# Altium footprint library PCB_Lib_Devzone.PcbLib: 491 footprints (part 3 of 31)
Each footprint in its own frame and in the unit in brackets; x right, y up, seen from the top. Pads: shape width x height; smd on the part's side, far side on the other; paste and mask are expansions set on the pad; w line width, h text height; cw(c..) or ccw(c..) is an arc to the next point about the centre after c.
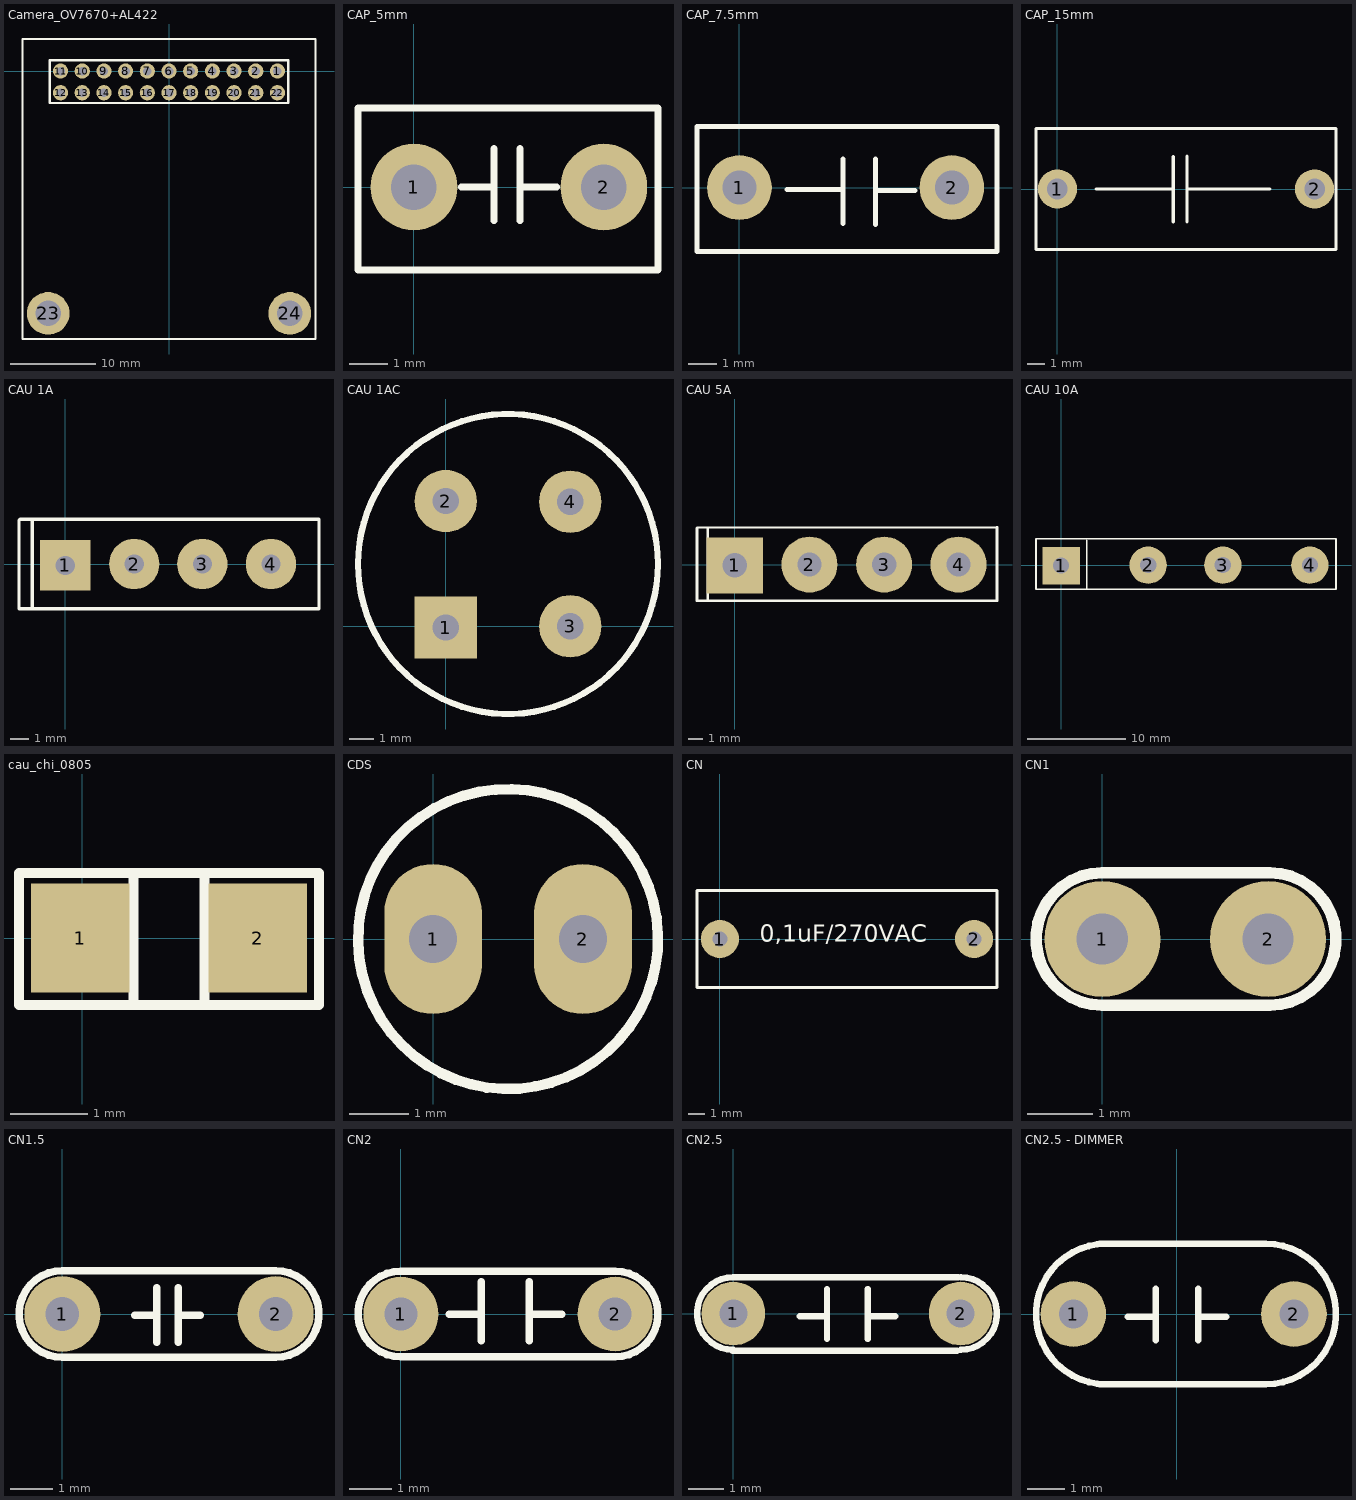
[diagram p2: the footprints below, top view; thin cyan lines are the x and y axes]

## Camera_OV7670+AL422 [mil]
pads (24):
  round 70 hole 39.37: 1(500,0) 2(400,0) 3(300,0) 4(200,0) 5(100,0) 6(0,0) 7(-100,0) 8(-200,0) 9(-300,0) 10(-400,0) 11(-500,0) 12(-500,-100) 13(-400,-100) 14(-300,-100) 15(-200,-100) 16(-100,-100) 17(0,-100) 18(100,-100) 19(200,-100) 20(300,-100) 21(400,-100) 22(500,-100)
  round 196.85 hole 118.11: 23(-557.09,-1117.56) 24(557.09,-1117.56)
Top Overlay:
  lines w10: -675.2,-1235.67 675.2,-1235.67 675.2,147.8 -675.2,147.8 -675.2,-1235.67 ; -550,-147 -550,50 550,50 550,-147 -550,-147

## CAP_5mm [mil]
pads (2):
  round 90 hole 47.24: 1(0,0) 2(196.85,0)
Top Overlay:
  lines w7: 49,0 83,0 ; 83,-35 83,0 ; 83,40 83,0 ; 110,-35 110,0 ; 110,40 110,0 ; 148,0 110,0 ; -58,-86 -58,82 253,82 253,-86 -58,-86

## CAP_7.5mm [mil]
pads (2):
  round 90 hole 47.24: 1(0,0) 2(295.28,0)
Top Overlay:
  lines w7: 66,-3 144,-3 ; 144,-50 144,-3 ; 144,40 144,-3 ; 189,-51 189,-4 ; 189,40 189,-4 ; 244,-4 189,-4 ; -59,-89 358,-89 358,85 -59,85 -59,-89

## CAP_15mm [mil]
pads (2):
  round 90 hole 47.24: 1(0,0) 2(590.55,0)
Top Overlay:
  lines w7: 89,0 266,0 266,75 ; 266,-76 266,19 ; 298,-76 298,76 ; 302,0 488,0 ; -49.21,-138.78 397,-138.78 639.76,-138.78 639.76,138.78 -49.21,138.78 -49.21,-138.78

## CAU 1A [mil] "CAU 1A DET"
height 800
pads (4):
  rect 110x110 hole 42: 1(0,-2)
  round 110 hole 42: 2(151,1) 3(300,1) 4(450,1)
Top Overlay:
  lines w7: -72,-95 -72,99 ; -101,-97 -101,97 -99,99 555,99 555,-97 -101,-97
3D body "SW3dPS-KBPM.STEP": height 453.36, standoff -499.4, extent -61.99,-90 511.99,107.24

## CAU 1AC [mil] "CAU 1A TRON"
height 800
pads (4):
  rect 100x100 hole 42: 1(0,-2)
  round 100 hole 42: 2(0,201) 3(200,0) 4(200,200)
Top Overlay:
  circle w10: c100,100 r240.88

## CAU 5A [mil] "CAU 5A DET"
height 800
pads (4):
  rect 150x150 hole 65: 1(0,-2)
  round 150 hole 65: 2(200,0) 3(400,0) 4(599,0)
Top Overlay:
  lines w7: -72,-95 -72,99 ; -101,-97 -101,97 -99,99 702,100 702,-97 -101,-97
3D body "SW3dPS-bridge 2.STEP": height 820.68, standoff -621.62, extent -138.98,-105 738.98,43.03

## CAU 10A [mil] "CAU 10A det"
height 800
pads (4):
  rect 150x150 hole 65: 1(0,-2)
  round 150 hole 65: 2(350,0) 3(650,0) 4(1000,0)
Top Overlay:
  lines w7: 103,-95 103,99 ; -101,-97 -101,104.86 1105,106.36 1105,-97 -101,-97

## cau_chi_0805 [mil]
pads (2):
  rect 50x55 smd: 1(-1,0) 2(89,0)
Top Overlay:
  lines w5: 26,-34 26,33 ; 62,-34 62,32 ; -32,-34 -32,33 120,33 120,-34 -32,-34
3D body "User Library-NFM21H.STEP": height 33.86, standoff -0.39, extent 4.63,-25 83.37,25

## CDS [mil] "QUANG TRO"
height 300
pads (2):
  oval 65x100 hole 32: 1(0,0) 2(100,0)
Top Overlay:
  lines w7: 136.62,-49.97 cw(c50,0) 137.42,-48.56
3D body "User Library-5mmPhotoResistor.STEP": height 159.37, standoff -76.85, extent -47.43,-99.42 129.74,97.43

## CN [mil] "Tu loc 220"
height 100
pads (2):
  round 90 hole 35: 1(0,0) 2(600,0)
Top Overlay:
  lines w7: -54,-115 654,-115 654,115 -54,115 -54,-115
  text "0,1uF/270VAC" at 94,-21 h70

## CN1 [mil]
height 200
pads (2):
  round 70 hole 31: 1(0,0) 2(100,0)
Top Overlay:
  lines w7: 100,-40 0,-40 cw(c0,0) 0,40 100,40 ; 101,-40 ccw(c101,0) 101,40
3D body "SW3dPS-Cap 100n.STEP": height 265, standoff -46.85, extent -59.93,-30 169.93,36.79

## CN1.5 [mil]
height 200
pads (2):
  round 70 hole 31: 1(0,0) 2(196.85,0)
Top Overlay:
  lines w7: 67,-1 87,-1 ; 87,-26 87,24 ; 107,-26 107,24 ; 107,-1 127,-1 ; 0,-40 cw(c0,0) 0,40 196.85,40 cw(c196.85,0) 196.85,-40 0,-40
3D body "cn104.STEP": height 235, standoff -76.85, extent -16.86,-33.39 213,33.4

## CN2 [mil]
height 200
pads (2):
  round 70 hole 31: 1(0,0) 2(200,0)
Top Overlay:
  lines w7: 45,0 75,0 ; 75,-25 75,30 ; 120,-25 120,30 ; 120,0 150,0 ; 0,-40 cw(c0,0) 0,40 200,40 cw(c200,0) 200,-40 0,-40
3D body "tu hoa 5mm.step": height 407.48, standoff -87.28, extent -54.48,-44.22 260.48,54.6

## CN2.5 [mil] "Tu pin to pin 250mil"
height 200
pads (2):
  round 70 hole 31: 1(0,0) 2(250,0)
Top Overlay:
  lines w7: -1,-41 246,-41 ; 0,-40 cw(c0,0) 0,40 247,40 ; 73,-3 103,-3 ; 103,-28 103,27 ; 148,-28 148,27 ; 148,-3 178,-3 ; 250,-40 ccw(c250,0) 250,40
3D body "User Library-6mm radial ceramic disc capacitor.STEP": height 454.65, standoff -868.96, extent 11,-80 247.22,69.61

## CN2.5 - DIMMER [mil] "Tu pin to pin 250mil"
height 200
pads (2):
  round 70 hole 31: 1(-110,0) 2(125,0)
Top Overlay:
  lines w7: -82,-75 95,-75 ; -82,75 95,75 ; -75,-74.8 cw(c-75,0) -75,74.8 ; -52,-3 -22,-3 ; -22,-28 -22,27 ; 23,-28 23,27 ; 23,-3 53,-3 ; 95,-74.8 ccw(c95,0) 95,74.8
3D body "User Library-Film Capacitor 6x8mm.step": height 538.88, standoff -130.41, extent -152.48,-80 162.48,77.48